# Altium integrated library Weidmueller_OMNIMATE_Signal.IntLib: 2550 symbols (part 1 of 45) (continued)
## 1001720000_Single (continued)
OMNIMATE Signal - series LL; PartNumber: 1001720000; Manufacturer: Weidmueller; Short_text_for_material: LL 5.00/04/90 3.2SN OR BX; Side_termination_characteristic: closed side; Mounting_onto_the_PCB: Solder connection; Pitch_mm: 5 mm; Pitch_inch: 0,197 inch; No_of_poles: 4; Solder_pin_length_mm: 3,2 mm; Contact_material: Cu-Leg; Contact_surface: tinned; Insulating_material: Wemid (PA); UL_94_flammability_rating: V-0; Rated_voltage_for_surge_voltage_class_pollution_degree_II_2: 500 V; Solid_min_H05_07_V_U: 0,5 mm²; Solid_max_H05_07_V_U: 6 mm²; Rated_voltage_use_group_B_UL_1059: 300 V; Rated_current_use_group_B_UL_1059: 20 A; Wire_cross_section_AWG_min_UL_1059: AWG 28; Wire_cross_section_AWG_max_UL_1059: AWG 12; PackageReference: LL_5_00_90_04; Colour: Orange; Packaging: Box; Qty: 100 PCS; Revision: V1; ComponentLink1Description: Manufacturer URL; ComponentLink1URL: http://www.weidmueller.com/; ComponentLink2Description: URL Link1; ComponentLink2URL: http://catalog.weidmueller.com/catalog/Start.do?localeId=en&ObjectID=1001720000
footprint LL_5_00_90_04 (OMNIMATE Signal - Serie LL  LL 5.00/04/90 3.2)
part A pins: A1
part B pins: A2
part C pins: A3
part D pins: A4
1 alternate drawing of the same symbol

## 1001850000
designator E?
OMNIMATE Signal - series LL; PartNumber: 1001850000; Manufacturer: Weidmueller; Short_text_for_material: LL 5.08/04/90 3.2SN OR BX; Side_termination_characteristic: closed side; Mounting_onto_the_PCB: Solder connection; Pitch_mm: 5,08 mm; Pitch_inch: 0,2 inch; No_of_poles: 4; Solder_pin_length_mm: 3,2 mm; Contact_material: Cu-Leg; Contact_surface: tinned; Insulating_material: Wemid (PA); UL_94_flammability_rating: V-0; Rated_voltage_for_surge_voltage_class_pollution_degree_II_2: 500 V; Solid_min_H05_07_V_U: 0,5 mm²; Solid_max_H05_07_V_U: 6 mm²; Rated_voltage_use_group_B_UL_1059: 300 V; Rated_current_use_group_B_UL_1059: 20 A; Wire_cross_section_AWG_min_UL_1059: AWG 28; Wire_cross_section_AWG_max_UL_1059: AWG 12; PackageReference: LL_5_08_90_04; Colour: Orange; Packaging: Box; Qty: 100 PCS; Revision: V1; ComponentLink1Description: Manufacturer URL; ComponentLink1URL: http://www.weidmueller.com/; ComponentLink2Description: URL Link1; ComponentLink2URL: http://catalog.weidmueller.com/catalog/Start.do?localeId=en&ObjectID=1001850000
footprint LL_5_08_90_04 (OMNIMATE Signal - Serie LL  LL 5.08/04/90 3.2)
pins: A1, A2, A3, A4
1 alternate drawing of the same symbol

## 1001850000_Single
designator E?
OMNIMATE Signal - series LL; PartNumber: 1001850000; Manufacturer: Weidmueller; Short_text_for_material: LL 5.08/04/90 3.2SN OR BX; Side_termination_characteristic: closed side; Mounting_onto_the_PCB: Solder connection; Pitch_mm: 5,08 mm; Pitch_inch: 0,2 inch; No_of_poles: 4; Solder_pin_length_mm: 3,2 mm; Contact_material: Cu-Leg; Contact_surface: tinned; Insulating_material: Wemid (PA); UL_94_flammability_rating: V-0; Rated_voltage_for_surge_voltage_class_pollution_degree_II_2: 500 V; Solid_min_H05_07_V_U: 0,5 mm²; Solid_max_H05_07_V_U: 6 mm²; Rated_voltage_use_group_B_UL_1059: 300 V; Rated_current_use_group_B_UL_1059: 20 A; Wire_cross_section_AWG_min_UL_1059: AWG 28; Wire_cross_section_AWG_max_UL_1059: AWG 12; PackageReference: LL_5_08_90_04; Colour: Orange; Packaging: Box; Qty: 100 PCS; Revision: V1; ComponentLink1Description: Manufacturer URL; ComponentLink1URL: http://www.weidmueller.com/; ComponentLink2Description: URL Link1; ComponentLink2URL: http://catalog.weidmueller.com/catalog/Start.do?localeId=en&ObjectID=1001850000
footprint LL_5_08_90_04 (OMNIMATE Signal - Serie LL  LL 5.08/04/90 3.2)
part A pins: A1
part B pins: A2
part C pins: A3
part D pins: A4
1 alternate drawing of the same symbol

## 1028720000
designator J?
OMNIMATE Signal - series BC/SC 3.81; PartNumber: 1028720000; Manufacturer: Weidmueller; Short_text_for_material: BCL-SMT 3.81/02/90LFI 1.5SN BK BX; Side_termination_characteristic: Solder flange inverted; Mounting_onto_the_PCB: Reflow solder connection; Pitch_mm: 3.81 mm; Pitch_inch: 0.15 inch; No_of_poles: 2; Outgoing_elbow: 90°; Solder_pin_length_mm: 1.5 mm; Contact_material: Cu-Leg; Contact_surface: tinned; Insulating_material: LCP GF; UL_94_flammability_rating: V-0; Rated_voltage_for_surge_voltage_class_pollution_degree_II_2: 320 V; Rated_voltage_use_group_B_UL_1059: 300 V; Rated_current_use_group_B_UL_1059: 10 A; PackageReference: BCL_SMT_3_81_90LFI_02; Colour: Black; Packaging: Box; Qty: 50 PCS; Revision: V1; ComponentLink1Description: Manufacturer URL; ComponentLink1URL: http://www.weidmueller.com/; ComponentLink2Description: URL Link1; ComponentLink2URL: http://catalog.weidmueller.com/catalog/Start.do?localeId=en&ObjectID=1028720000
footprint BCL_SMT_3_81_90LFI_02 (OMNIMATE Signal - Serie BC/SC 3.81  BCL-SMT 3.81/02/90LFI 1.5)
pins: A1, A2

## 1028720000_Single
designator J?
OMNIMATE Signal - series BC/SC 3.81; PartNumber: 1028720000; Manufacturer: Weidmueller; Short_text_for_material: BCL-SMT 3.81/02/90LFI 1.5SN BK BX; Side_termination_characteristic: Solder flange inverted; Mounting_onto_the_PCB: Reflow solder connection; Pitch_mm: 3.81 mm; Pitch_inch: 0.15 inch; No_of_poles: 2; Outgoing_elbow: 90°; Solder_pin_length_mm: 1.5 mm; Contact_material: Cu-Leg; Contact_surface: tinned; Insulating_material: LCP GF; UL_94_flammability_rating: V-0; Rated_voltage_for_surge_voltage_class_pollution_degree_II_2: 320 V; Rated_voltage_use_group_B_UL_1059: 300 V; Rated_current_use_group_B_UL_1059: 10 A; PackageReference: BCL_SMT_3_81_90LFI_02; Colour: Black; Packaging: Box; Qty: 50 PCS; Revision: V1; ComponentLink1Description: Manufacturer URL; ComponentLink1URL: http://www.weidmueller.com/; ComponentLink2Description: URL Link1; ComponentLink2URL: http://catalog.weidmueller.com/catalog/Start.do?localeId=en&ObjectID=1028720000
footprint BCL_SMT_3_81_90LFI_02 (OMNIMATE Signal - Serie BC/SC 3.81  BCL-SMT 3.81/02/90LFI 1.5)
part A pins: A1
part B pins: A2

## 1028730000
designator J?
OMNIMATE Signal - series BC/SC 3.81; PartNumber: 1028730000; Manufacturer: Weidmueller; Short_text_for_material: BCL-SMT 3.81/03/90LFI 1.5SN BK BX; Side_termination_characteristic: Solder flange inverted; Mounting_onto_the_PCB: Reflow solder connection; Pitch_mm: 3.81 mm; Pitch_inch: 0.15 inch; No_of_poles: 3; Outgoing_elbow: 90°; Solder_pin_length_mm: 1.5 mm; Contact_material: Cu-Leg; Contact_surface: tinned; Insulating_material: LCP GF; UL_94_flammability_rating: V-0; Rated_voltage_for_surge_voltage_class_pollution_degree_II_2: 320 V; Rated_voltage_use_group_B_UL_1059: 300 V; Rated_current_use_group_B_UL_1059: 10 A; PackageReference: BCL_SMT_3_81_90LFI_03; Colour: Black; Packaging: Box; Qty: 50 PCS; Revision: V1; ComponentLink1Description: Manufacturer URL; ComponentLink1URL: http://www.weidmueller.com/; ComponentLink2Description: URL Link1; ComponentLink2URL: http://catalog.weidmueller.com/catalog/Start.do?localeId=en&ObjectID=1028730000
footprint BCL_SMT_3_81_90LFI_03 (OMNIMATE Signal - Serie BC/SC 3.81  BCL-SMT 3.81/03/90LFI 1.5)
pins: A1, A2, A3

## 1028730000_Single
designator J?
OMNIMATE Signal - series BC/SC 3.81; PartNumber: 1028730000; Manufacturer: Weidmueller; Short_text_for_material: BCL-SMT 3.81/03/90LFI 1.5SN BK BX; Side_termination_characteristic: Solder flange inverted; Mounting_onto_the_PCB: Reflow solder connection; Pitch_mm: 3.81 mm; Pitch_inch: 0.15 inch; No_of_poles: 3; Outgoing_elbow: 90°; Solder_pin_length_mm: 1.5 mm; Contact_material: Cu-Leg; Contact_surface: tinned; Insulating_material: LCP GF; UL_94_flammability_rating: V-0; Rated_voltage_for_surge_voltage_class_pollution_degree_II_2: 320 V; Rated_voltage_use_group_B_UL_1059: 300 V; Rated_current_use_group_B_UL_1059: 10 A; PackageReference: BCL_SMT_3_81_90LFI_03; Colour: Black; Packaging: Box; Qty: 50 PCS; Revision: V1; ComponentLink1Description: Manufacturer URL; ComponentLink1URL: http://www.weidmueller.com/; ComponentLink2Description: URL Link1; ComponentLink2URL: http://catalog.weidmueller.com/catalog/Start.do?localeId=en&ObjectID=1028730000
footprint BCL_SMT_3_81_90LFI_03 (OMNIMATE Signal - Serie BC/SC 3.81  BCL-SMT 3.81/03/90LFI 1.5)
part A pins: A1
part B pins: A2
part C pins: A3

## 1028740000
designator J?
OMNIMATE Signal - series BC/SC 3.81; PartNumber: 1028740000; Manufacturer: Weidmueller; Short_text_for_material: BCL-SMT 3.81/04/90LFI 1.5SN BK BX; Side_termination_characteristic: Solder flange inverted; Mounting_onto_the_PCB: Reflow solder connection; Pitch_mm: 3.81 mm; Pitch_inch: 0.15 inch; No_of_poles: 4; Outgoing_elbow: 90°; Solder_pin_length_mm: 1.5 mm; Contact_material: Cu-Leg; Contact_surface: tinned; Insulating_material: LCP GF; UL_94_flammability_rating: V-0; Rated_voltage_for_surge_voltage_class_pollution_degree_II_2: 320 V; Rated_voltage_use_group_B_UL_1059: 300 V; Rated_current_use_group_B_UL_1059: 10 A; PackageReference: BCL_SMT_3_81_90LFI_04; Colour: Black; Packaging: Box; Qty: 50 PCS; Revision: V1; ComponentLink1Description: Manufacturer URL; ComponentLink1URL: http://www.weidmueller.com/; ComponentLink2Description: URL Link1; ComponentLink2URL: http://catalog.weidmueller.com/catalog/Start.do?localeId=en&ObjectID=1028740000
footprint BCL_SMT_3_81_90LFI_04 (OMNIMATE Signal - Serie BC/SC 3.81  BCL-SMT 3.81/04/90LFI 1.5)
pins: A1, A2, A3, A4

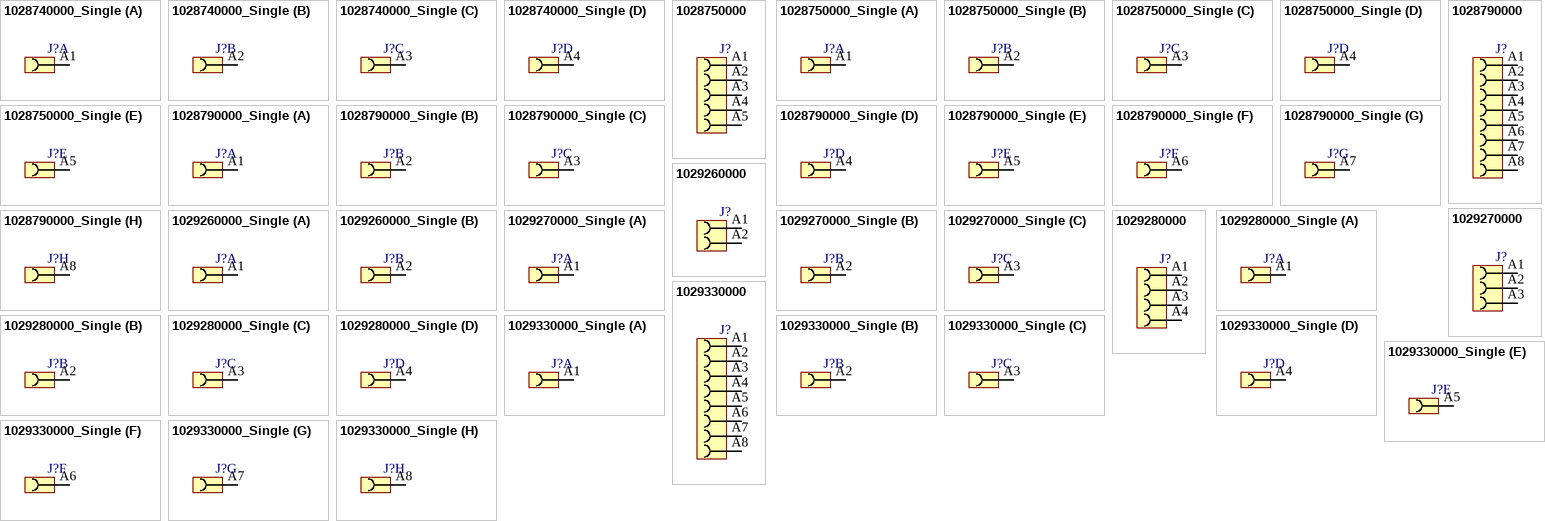
[diagram p2: symbols 1028740000_Single to 1029330000_Single]

## 1028740000_Single
designator J?
OMNIMATE Signal - series BC/SC 3.81; PartNumber: 1028740000; Manufacturer: Weidmueller; Short_text_for_material: BCL-SMT 3.81/04/90LFI 1.5SN BK BX; Side_termination_characteristic: Solder flange inverted; Mounting_onto_the_PCB: Reflow solder connection; Pitch_mm: 3.81 mm; Pitch_inch: 0.15 inch; No_of_poles: 4; Outgoing_elbow: 90°; Solder_pin_length_mm: 1.5 mm; Contact_material: Cu-Leg; Contact_surface: tinned; Insulating_material: LCP GF; UL_94_flammability_rating: V-0; Rated_voltage_for_surge_voltage_class_pollution_degree_II_2: 320 V; Rated_voltage_use_group_B_UL_1059: 300 V; Rated_current_use_group_B_UL_1059: 10 A; PackageReference: BCL_SMT_3_81_90LFI_04; Colour: Black; Packaging: Box; Qty: 50 PCS; Revision: V1; ComponentLink1Description: Manufacturer URL; ComponentLink1URL: http://www.weidmueller.com/; ComponentLink2Description: URL Link1; ComponentLink2URL: http://catalog.weidmueller.com/catalog/Start.do?localeId=en&ObjectID=1028740000
footprint BCL_SMT_3_81_90LFI_04 (OMNIMATE Signal - Serie BC/SC 3.81  BCL-SMT 3.81/04/90LFI 1.5)
part A pins: A1
part B pins: A2
part C pins: A3
part D pins: A4

## 1028750000
designator J?
OMNIMATE Signal - series BC/SC 3.81; PartNumber: 1028750000; Manufacturer: Weidmueller; Short_text_for_material: BCL-SMT 3.81/05/90LFI 1.5SN BK BX; Side_termination_characteristic: Solder flange inverted; Mounting_onto_the_PCB: Reflow solder connection; Pitch_mm: 3.81 mm; Pitch_inch: 0.15 inch; No_of_poles: 5; Outgoing_elbow: 90°; Solder_pin_length_mm: 1.5 mm; Contact_material: Cu-Leg; Contact_surface: tinned; Insulating_material: LCP GF; UL_94_flammability_rating: V-0; Rated_voltage_for_surge_voltage_class_pollution_degree_II_2: 320 V; Rated_voltage_use_group_B_UL_1059: 300 V; Rated_current_use_group_B_UL_1059: 10 A; PackageReference: BCL_SMT_3_81_90LFI_05; Colour: Black; Packaging: Box; Qty: 50 PCS; Revision: V1; ComponentLink1Description: Manufacturer URL; ComponentLink1URL: http://www.weidmueller.com/; ComponentLink2Description: URL Link1; ComponentLink2URL: http://catalog.weidmueller.com/catalog/Start.do?localeId=en&ObjectID=1028750000
footprint BCL_SMT_3_81_90LFI_05 (OMNIMATE Signal - Serie BC/SC 3.81  BCL-SMT 3.81/05/90LFI 1.5)
pins: A1, A2, A3, A4, A5

## 1028750000_Single
designator J?
OMNIMATE Signal - series BC/SC 3.81; PartNumber: 1028750000; Manufacturer: Weidmueller; Short_text_for_material: BCL-SMT 3.81/05/90LFI 1.5SN BK BX; Side_termination_characteristic: Solder flange inverted; Mounting_onto_the_PCB: Reflow solder connection; Pitch_mm: 3.81 mm; Pitch_inch: 0.15 inch; No_of_poles: 5; Outgoing_elbow: 90°; Solder_pin_length_mm: 1.5 mm; Contact_material: Cu-Leg; Contact_surface: tinned; Insulating_material: LCP GF; UL_94_flammability_rating: V-0; Rated_voltage_for_surge_voltage_class_pollution_degree_II_2: 320 V; Rated_voltage_use_group_B_UL_1059: 300 V; Rated_current_use_group_B_UL_1059: 10 A; PackageReference: BCL_SMT_3_81_90LFI_05; Colour: Black; Packaging: Box; Qty: 50 PCS; Revision: V1; ComponentLink1Description: Manufacturer URL; ComponentLink1URL: http://www.weidmueller.com/; ComponentLink2Description: URL Link1; ComponentLink2URL: http://catalog.weidmueller.com/catalog/Start.do?localeId=en&ObjectID=1028750000
footprint BCL_SMT_3_81_90LFI_05 (OMNIMATE Signal - Serie BC/SC 3.81  BCL-SMT 3.81/05/90LFI 1.5)
part A pins: A1
part B pins: A2
part C pins: A3
part D pins: A4
part E pins: A5

## 1028790000
designator J?
OMNIMATE Signal - series BC/SC 3.81; PartNumber: 1028790000; Manufacturer: Weidmueller; Short_text_for_material: BCL-SMT 3.81/08/90LFI 1.5SN BK BX; Side_termination_characteristic: Solder flange inverted; Mounting_onto_the_PCB: Reflow solder connection; Pitch_mm: 3.81 mm; Pitch_inch: 0.15 inch; No_of_poles: 8; Outgoing_elbow: 90°; Solder_pin_length_mm: 1.5 mm; Contact_material: Cu-Leg; Contact_surface: tinned; Insulating_material: LCP GF; UL_94_flammability_rating: V-0; Rated_voltage_for_surge_voltage_class_pollution_degree_II_2: 320 V; Rated_voltage_use_group_B_UL_1059: 300 V; Rated_current_use_group_B_UL_1059: 10 A; PackageReference: BCL_SMT_3_81_90LFI_08; Colour: Black; Packaging: Box; Qty: 50 PCS; Revision: V1; ComponentLink1Description: Manufacturer URL; ComponentLink1URL: http://www.weidmueller.com/; ComponentLink2Description: URL Link1; ComponentLink2URL: http://catalog.weidmueller.com/catalog/Start.do?localeId=en&ObjectID=1028790000
footprint BCL_SMT_3_81_90LFI_08 (OMNIMATE Signal - Serie BC/SC 3.81  BCL-SMT 3.81/08/90LFI 1.5)
pins: A1, A2, A3, A4, A5, A6, A7, A8

## 1028790000_Single
designator J?
OMNIMATE Signal - series BC/SC 3.81; PartNumber: 1028790000; Manufacturer: Weidmueller; Short_text_for_material: BCL-SMT 3.81/08/90LFI 1.5SN BK BX; Side_termination_characteristic: Solder flange inverted; Mounting_onto_the_PCB: Reflow solder connection; Pitch_mm: 3.81 mm; Pitch_inch: 0.15 inch; No_of_poles: 8; Outgoing_elbow: 90°; Solder_pin_length_mm: 1.5 mm; Contact_material: Cu-Leg; Contact_surface: tinned; Insulating_material: LCP GF; UL_94_flammability_rating: V-0; Rated_voltage_for_surge_voltage_class_pollution_degree_II_2: 320 V; Rated_voltage_use_group_B_UL_1059: 300 V; Rated_current_use_group_B_UL_1059: 10 A; PackageReference: BCL_SMT_3_81_90LFI_08; Colour: Black; Packaging: Box; Qty: 50 PCS; Revision: V1; ComponentLink1Description: Manufacturer URL; ComponentLink1URL: http://www.weidmueller.com/; ComponentLink2Description: URL Link1; ComponentLink2URL: http://catalog.weidmueller.com/catalog/Start.do?localeId=en&ObjectID=1028790000
footprint BCL_SMT_3_81_90LFI_08 (OMNIMATE Signal - Serie BC/SC 3.81  BCL-SMT 3.81/08/90LFI 1.5)
part A pins: A1
part B pins: A2
part C pins: A3
part D pins: A4
part E pins: A5
part F pins: A6
part G pins: A7
part H pins: A8

## 1029260000
designator J?
OMNIMATE Signal - series BC/SC 3.81; PartNumber: 1029260000; Manufacturer: Weidmueller; Short_text_for_material: BCL-SMT 3.81/02/180LFI 1.5SN BK BX; Side_termination_characteristic: Solder flange inverted; Mounting_onto_the_PCB: Reflow solder connection; Pitch_mm: 3.81 mm; Pitch_inch: 0.15 inch; No_of_poles: 2; Outgoing_elbow: 180°; Solder_pin_length_mm: 1.5 mm; Contact_material: Cu-Leg; Contact_surface: tinned; Insulating_material: LCP GF; UL_94_flammability_rating: V-0; Rated_voltage_for_surge_voltage_class_pollution_degree_II_2: 320 V; Rated_voltage_use_group_B_UL_1059: 300 V; Rated_current_use_group_B_UL_1059: 10 A; PackageReference: BCL_SMT_3_81_180LFI_02; Colour: Black; Packaging: Box; Qty: 50 PCS; Revision: V1; ComponentLink1Description: Manufacturer URL; ComponentLink1URL: http://www.weidmueller.com/; ComponentLink2Description: URL Link1; ComponentLink2URL: http://catalog.weidmueller.com/catalog/Start.do?localeId=en&ObjectID=1029260000
footprint BCL_SMT_3_81_180LFI_02 (OMNIMATE Signal - Serie BC/SC 3.81  BCL-SMT 3.81/02/180LFI 1.5)
pins: A1, A2

## 1029260000_Single
designator J?
OMNIMATE Signal - series BC/SC 3.81; PartNumber: 1029260000; Manufacturer: Weidmueller; Short_text_for_material: BCL-SMT 3.81/02/180LFI 1.5SN BK BX; Side_termination_characteristic: Solder flange inverted; Mounting_onto_the_PCB: Reflow solder connection; Pitch_mm: 3.81 mm; Pitch_inch: 0.15 inch; No_of_poles: 2; Outgoing_elbow: 180°; Solder_pin_length_mm: 1.5 mm; Contact_material: Cu-Leg; Contact_surface: tinned; Insulating_material: LCP GF; UL_94_flammability_rating: V-0; Rated_voltage_for_surge_voltage_class_pollution_degree_II_2: 320 V; Rated_voltage_use_group_B_UL_1059: 300 V; Rated_current_use_group_B_UL_1059: 10 A; PackageReference: BCL_SMT_3_81_180LFI_02; Colour: Black; Packaging: Box; Qty: 50 PCS; Revision: V1; ComponentLink1Description: Manufacturer URL; ComponentLink1URL: http://www.weidmueller.com/; ComponentLink2Description: URL Link1; ComponentLink2URL: http://catalog.weidmueller.com/catalog/Start.do?localeId=en&ObjectID=1029260000
footprint BCL_SMT_3_81_180LFI_02 (OMNIMATE Signal - Serie BC/SC 3.81  BCL-SMT 3.81/02/180LFI 1.5)
part A pins: A1
part B pins: A2

## 1029270000
designator J?
OMNIMATE Signal - series BC/SC 3.81; PartNumber: 1029270000; Manufacturer: Weidmueller; Short_text_for_material: BCL-SMT 3.81/03/180LFI 1.5SN BK BX; Side_termination_characteristic: Solder flange inverted; Mounting_onto_the_PCB: Reflow solder connection; Pitch_mm: 3.81 mm; Pitch_inch: 0.15 inch; No_of_poles: 3; Outgoing_elbow: 180°; Solder_pin_length_mm: 1.5 mm; Contact_material: Cu-Leg; Contact_surface: tinned; Insulating_material: LCP GF; UL_94_flammability_rating: V-0; Rated_voltage_for_surge_voltage_class_pollution_degree_II_2: 320 V; Rated_voltage_use_group_B_UL_1059: 300 V; Rated_current_use_group_B_UL_1059: 10 A; PackageReference: BCL_SMT_3_81_180LFI_03; Colour: Black; Packaging: Box; Qty: 50 PCS; Revision: V1; ComponentLink1Description: Manufacturer URL; ComponentLink1URL: http://www.weidmueller.com/; ComponentLink2Description: URL Link1; ComponentLink2URL: http://catalog.weidmueller.com/catalog/Start.do?localeId=en&ObjectID=1029270000
footprint BCL_SMT_3_81_180LFI_03 (OMNIMATE Signal - Serie BC/SC 3.81  BCL-SMT 3.81/03/180LFI 1.5)
pins: A1, A2, A3

## 1029270000_Single
designator J?
OMNIMATE Signal - series BC/SC 3.81; PartNumber: 1029270000; Manufacturer: Weidmueller; Short_text_for_material: BCL-SMT 3.81/03/180LFI 1.5SN BK BX; Side_termination_characteristic: Solder flange inverted; Mounting_onto_the_PCB: Reflow solder connection; Pitch_mm: 3.81 mm; Pitch_inch: 0.15 inch; No_of_poles: 3; Outgoing_elbow: 180°; Solder_pin_length_mm: 1.5 mm; Contact_material: Cu-Leg; Contact_surface: tinned; Insulating_material: LCP GF; UL_94_flammability_rating: V-0; Rated_voltage_for_surge_voltage_class_pollution_degree_II_2: 320 V; Rated_voltage_use_group_B_UL_1059: 300 V; Rated_current_use_group_B_UL_1059: 10 A; PackageReference: BCL_SMT_3_81_180LFI_03; Colour: Black; Packaging: Box; Qty: 50 PCS; Revision: V1; ComponentLink1Description: Manufacturer URL; ComponentLink1URL: http://www.weidmueller.com/; ComponentLink2Description: URL Link1; ComponentLink2URL: http://catalog.weidmueller.com/catalog/Start.do?localeId=en&ObjectID=1029270000
footprint BCL_SMT_3_81_180LFI_03 (OMNIMATE Signal - Serie BC/SC 3.81  BCL-SMT 3.81/03/180LFI 1.5)
part A pins: A1
part B pins: A2
part C pins: A3

## 1029280000
designator J?
OMNIMATE Signal - series BC/SC 3.81; PartNumber: 1029280000; Manufacturer: Weidmueller; Short_text_for_material: BCL-SMT 3.81/04/180LFI 1.5SN BK BX; Side_termination_characteristic: Solder flange inverted; Mounting_onto_the_PCB: Reflow solder connection; Pitch_mm: 3.81 mm; Pitch_inch: 0.15 inch; No_of_poles: 4; Outgoing_elbow: 180°; Solder_pin_length_mm: 1.5 mm; Contact_material: Cu-Leg; Contact_surface: tinned; Insulating_material: LCP GF; UL_94_flammability_rating: V-0; Rated_voltage_for_surge_voltage_class_pollution_degree_II_2: 320 V; Rated_voltage_use_group_B_UL_1059: 300 V; Rated_current_use_group_B_UL_1059: 10 A; PackageReference: BCL_SMT_3_81_180LFI_04; Colour: Black; Packaging: Box; Qty: 50 PCS; Revision: V1; ComponentLink1Description: Manufacturer URL; ComponentLink1URL: http://www.weidmueller.com/; ComponentLink2Description: URL Link1; ComponentLink2URL: http://catalog.weidmueller.com/catalog/Start.do?localeId=en&ObjectID=1029280000
footprint BCL_SMT_3_81_180LFI_04 (OMNIMATE Signal - Serie BC/SC 3.81  BCL-SMT 3.81/04/180LFI 1.5)
pins: A1, A2, A3, A4

## 1029280000_Single
designator J?
OMNIMATE Signal - series BC/SC 3.81; PartNumber: 1029280000; Manufacturer: Weidmueller; Short_text_for_material: BCL-SMT 3.81/04/180LFI 1.5SN BK BX; Side_termination_characteristic: Solder flange inverted; Mounting_onto_the_PCB: Reflow solder connection; Pitch_mm: 3.81 mm; Pitch_inch: 0.15 inch; No_of_poles: 4; Outgoing_elbow: 180°; Solder_pin_length_mm: 1.5 mm; Contact_material: Cu-Leg; Contact_surface: tinned; Insulating_material: LCP GF; UL_94_flammability_rating: V-0; Rated_voltage_for_surge_voltage_class_pollution_degree_II_2: 320 V; Rated_voltage_use_group_B_UL_1059: 300 V; Rated_current_use_group_B_UL_1059: 10 A; PackageReference: BCL_SMT_3_81_180LFI_04; Colour: Black; Packaging: Box; Qty: 50 PCS; Revision: V1; ComponentLink1Description: Manufacturer URL; ComponentLink1URL: http://www.weidmueller.com/; ComponentLink2Description: URL Link1; ComponentLink2URL: http://catalog.weidmueller.com/catalog/Start.do?localeId=en&ObjectID=1029280000
footprint BCL_SMT_3_81_180LFI_04 (OMNIMATE Signal - Serie BC/SC 3.81  BCL-SMT 3.81/04/180LFI 1.5)
part A pins: A1
part B pins: A2
part C pins: A3
part D pins: A4

## 1029330000
designator J?
OMNIMATE Signal - series BC/SC 3.81; PartNumber: 1029330000; Manufacturer: Weidmueller; Short_text_for_material: BCL-SMT 3.81/08/180LFI 1.5SN BK BX; Side_termination_characteristic: Solder flange inverted; Mounting_onto_the_PCB: Reflow solder connection; Pitch_mm: 3.81 mm; Pitch_inch: 0.15 inch; No_of_poles: 8; Outgoing_elbow: 180°; Solder_pin_length_mm: 1.5 mm; Contact_material: Cu-Leg; Contact_surface: tinned; Insulating_material: LCP GF; UL_94_flammability_rating: V-0; Rated_voltage_for_surge_voltage_class_pollution_degree_II_2: 320 V; Rated_voltage_use_group_B_UL_1059: 300 V; Rated_current_use_group_B_UL_1059: 10 A; PackageReference: BCL_SMT_3_81_180LFI_08; Colour: Black; Packaging: Box; Qty: 50 PCS; Revision: V1; ComponentLink1Description: Manufacturer URL; ComponentLink1URL: http://www.weidmueller.com/; ComponentLink2Description: URL Link1; ComponentLink2URL: http://catalog.weidmueller.com/catalog/Start.do?localeId=en&ObjectID=1029330000
footprint BCL_SMT_3_81_180LFI_08 (OMNIMATE Signal - Serie BC/SC 3.81  BCL-SMT 3.81/08/180LFI 1.5)
pins: A1, A2, A3, A4, A5, A6, A7, A8

## 1029330000_Single
designator J?
OMNIMATE Signal - series BC/SC 3.81; PartNumber: 1029330000; Manufacturer: Weidmueller; Short_text_for_material: BCL-SMT 3.81/08/180LFI 1.5SN BK BX; Side_termination_characteristic: Solder flange inverted; Mounting_onto_the_PCB: Reflow solder connection; Pitch_mm: 3.81 mm; Pitch_inch: 0.15 inch; No_of_poles: 8; Outgoing_elbow: 180°; Solder_pin_length_mm: 1.5 mm; Contact_material: Cu-Leg; Contact_surface: tinned; Insulating_material: LCP GF; UL_94_flammability_rating: V-0; Rated_voltage_for_surge_voltage_class_pollution_degree_II_2: 320 V; Rated_voltage_use_group_B_UL_1059: 300 V; Rated_current_use_group_B_UL_1059: 10 A; PackageReference: BCL_SMT_3_81_180LFI_08; Colour: Black; Packaging: Box; Qty: 50 PCS; Revision: V1; ComponentLink1Description: Manufacturer URL; ComponentLink1URL: http://www.weidmueller.com/; ComponentLink2Description: URL Link1; ComponentLink2URL: http://catalog.weidmueller.com/catalog/Start.do?localeId=en&ObjectID=1029330000
footprint BCL_SMT_3_81_180LFI_08 (OMNIMATE Signal - Serie BC/SC 3.81  BCL-SMT 3.81/08/180LFI 1.5)
part A pins: A1
part B pins: A2
part C pins: A3
part D pins: A4
part E pins: A5
part F pins: A6
part G pins: A7
part H pins: A8

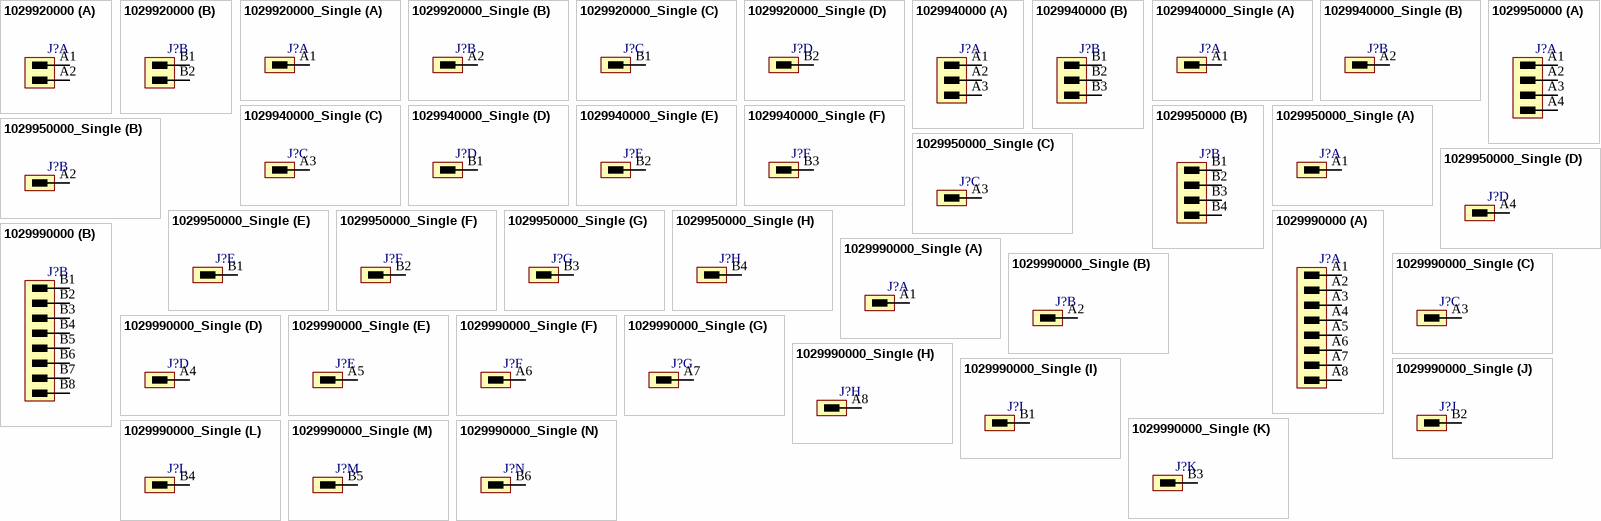
[diagram p3: symbols 1029920000 to 1029990000_Single]

## 1029920000
designator J?
OMNIMATE Signal - series BC/SC 3.81; PartNumber: 1029920000; Manufacturer: Weidmueller; Short_text_for_material: SCD 3.81/04/180G 3.2SN OR BX; Side_termination_characteristic: closed side; Mounting_onto_the_PCB: Solder connection; Pitch_mm: 3.81 mm; Pitch_inch: 0.15 inch; No_of_poles: 4; Outgoing_elbow: 180°; Solder_pin_length_mm: 3.2 mm; Contact_material: Cu-Leg; Contact_surface: tinned; Insulating_material: PA GF; UL_94_flammability_rating: V-0; Rated_voltage_for_surge_voltage_class_pollution_degree_II_2: 320 V; Rated_voltage_use_group_B_UL_1059: 300 V; Rated_current_use_group_B_UL_1059: 10 A; PackageReference: SCD_3_81_180G_04; Colour: Orange; Packaging: Box; Qty: 50 PCS; Revision: V1; ComponentLink1Description: Manufacturer URL; ComponentLink1URL: http://www.weidmueller.com/; ComponentLink2Description: URL Link1; ComponentLink2URL: http://catalog.weidmueller.com/catalog/Start.do?localeId=en&ObjectID=1029920000
footprint SCD_3_81_180G_04 (OMNIMATE Signal - Serie BC/SC 3.81  SCD 3.81/04/180G 3.2)
part A pins: A1, A2
part B pins: B1, B2

## 1029920000_Single
designator J?
OMNIMATE Signal - series BC/SC 3.81; PartNumber: 1029920000; Manufacturer: Weidmueller; Short_text_for_material: SCD 3.81/04/180G 3.2SN OR BX; Side_termination_characteristic: closed side; Mounting_onto_the_PCB: Solder connection; Pitch_mm: 3.81 mm; Pitch_inch: 0.15 inch; No_of_poles: 4; Outgoing_elbow: 180°; Solder_pin_length_mm: 3.2 mm; Contact_material: Cu-Leg; Contact_surface: tinned; Insulating_material: PA GF; UL_94_flammability_rating: V-0; Rated_voltage_for_surge_voltage_class_pollution_degree_II_2: 320 V; Rated_voltage_use_group_B_UL_1059: 300 V; Rated_current_use_group_B_UL_1059: 10 A; PackageReference: SCD_3_81_180G_04; Colour: Orange; Packaging: Box; Qty: 50 PCS; Revision: V1; ComponentLink1Description: Manufacturer URL; ComponentLink1URL: http://www.weidmueller.com/; ComponentLink2Description: URL Link1; ComponentLink2URL: http://catalog.weidmueller.com/catalog/Start.do?localeId=en&ObjectID=1029920000
footprint SCD_3_81_180G_04 (OMNIMATE Signal - Serie BC/SC 3.81  SCD 3.81/04/180G 3.2)
part A pins: A1
part B pins: A2
part C pins: B1
part D pins: B2

## 1029940000
designator J?
OMNIMATE Signal - series BC/SC 3.81; PartNumber: 1029940000; Manufacturer: Weidmueller; Short_text_for_material: SCD 3.81/06/180G 3.2SN OR BX; Side_termination_characteristic: closed side; Mounting_onto_the_PCB: Solder connection; Pitch_mm: 3.81 mm; Pitch_inch: 0.15 inch; No_of_poles: 6; Outgoing_elbow: 180°; Solder_pin_length_mm: 3.2 mm; Contact_material: Cu-Leg; Contact_surface: tinned; Insulating_material: PA GF; UL_94_flammability_rating: V-0; Rated_voltage_for_surge_voltage_class_pollution_degree_II_2: 320 V; Rated_voltage_use_group_B_UL_1059: 300 V; Rated_current_use_group_B_UL_1059: 10 A; PackageReference: SCD_3_81_180G_06; Colour: Orange; Packaging: Box; Qty: 50 PCS; Revision: V1; ComponentLink1Description: Manufacturer URL; ComponentLink1URL: http://www.weidmueller.com/; ComponentLink2Description: URL Link1; ComponentLink2URL: http://catalog.weidmueller.com/catalog/Start.do?localeId=en&ObjectID=1029940000
footprint SCD_3_81_180G_06 (OMNIMATE Signal - Serie BC/SC 3.81  SCD 3.81/06/180G 3.2)
part A pins: A1, A2, A3
part B pins: B1, B2, B3

## 1029940000_Single
designator J?
OMNIMATE Signal - series BC/SC 3.81; PartNumber: 1029940000; Manufacturer: Weidmueller; Short_text_for_material: SCD 3.81/06/180G 3.2SN OR BX; Side_termination_characteristic: closed side; Mounting_onto_the_PCB: Solder connection; Pitch_mm: 3.81 mm; Pitch_inch: 0.15 inch; No_of_poles: 6; Outgoing_elbow: 180°; Solder_pin_length_mm: 3.2 mm; Contact_material: Cu-Leg; Contact_surface: tinned; Insulating_material: PA GF; UL_94_flammability_rating: V-0; Rated_voltage_for_surge_voltage_class_pollution_degree_II_2: 320 V; Rated_voltage_use_group_B_UL_1059: 300 V; Rated_current_use_group_B_UL_1059: 10 A; PackageReference: SCD_3_81_180G_06; Colour: Orange; Packaging: Box; Qty: 50 PCS; Revision: V1; ComponentLink1Description: Manufacturer URL; ComponentLink1URL: http://www.weidmueller.com/; ComponentLink2Description: URL Link1; ComponentLink2URL: http://catalog.weidmueller.com/catalog/Start.do?localeId=en&ObjectID=1029940000
footprint SCD_3_81_180G_06 (OMNIMATE Signal - Serie BC/SC 3.81  SCD 3.81/06/180G 3.2)
part A pins: A1
part B pins: A2
part C pins: A3
part D pins: B1
part E pins: B2
part F pins: B3

## 1029950000
designator J?
OMNIMATE Signal - series BC/SC 3.81; PartNumber: 1029950000; Manufacturer: Weidmueller; Short_text_for_material: SCD 3.81/08/180G 3.2SN OR BX; Side_termination_characteristic: closed side; Mounting_onto_the_PCB: Solder connection; Pitch_mm: 3.81 mm; Pitch_inch: 0.15 inch; No_of_poles: 8; Outgoing_elbow: 180°; Solder_pin_length_mm: 3.2 mm; Contact_material: Cu-Leg; Contact_surface: tinned; Insulating_material: PA GF; UL_94_flammability_rating: V-0; Rated_voltage_for_surge_voltage_class_pollution_degree_II_2: 320 V; Rated_voltage_use_group_B_UL_1059: 300 V; Rated_current_use_group_B_UL_1059: 10 A; PackageReference: SCD_3_81_180G_08; Colour: Orange; Packaging: Box; Qty: 50 PCS; Revision: V1; ComponentLink1Description: Manufacturer URL; ComponentLink1URL: http://www.weidmueller.com/; ComponentLink2Description: URL Link1; ComponentLink2URL: http://catalog.weidmueller.com/catalog/Start.do?localeId=en&ObjectID=1029950000
footprint SCD_3_81_180G_08 (OMNIMATE Signal - Serie BC/SC 3.81  SCD 3.81/08/180G 3.2)
part A pins: A1, A2, A3, A4
part B pins: B1, B2, B3, B4

## 1029950000_Single
designator J?
OMNIMATE Signal - series BC/SC 3.81; PartNumber: 1029950000; Manufacturer: Weidmueller; Short_text_for_material: SCD 3.81/08/180G 3.2SN OR BX; Side_termination_characteristic: closed side; Mounting_onto_the_PCB: Solder connection; Pitch_mm: 3.81 mm; Pitch_inch: 0.15 inch; No_of_poles: 8; Outgoing_elbow: 180°; Solder_pin_length_mm: 3.2 mm; Contact_material: Cu-Leg; Contact_surface: tinned; Insulating_material: PA GF; UL_94_flammability_rating: V-0; Rated_voltage_for_surge_voltage_class_pollution_degree_II_2: 320 V; Rated_voltage_use_group_B_UL_1059: 300 V; Rated_current_use_group_B_UL_1059: 10 A; PackageReference: SCD_3_81_180G_08; Colour: Orange; Packaging: Box; Qty: 50 PCS; Revision: V1; ComponentLink1Description: Manufacturer URL; ComponentLink1URL: http://www.weidmueller.com/; ComponentLink2Description: URL Link1; ComponentLink2URL: http://catalog.weidmueller.com/catalog/Start.do?localeId=en&ObjectID=1029950000
footprint SCD_3_81_180G_08 (OMNIMATE Signal - Serie BC/SC 3.81  SCD 3.81/08/180G 3.2)
part A pins: A1
part B pins: A2
part C pins: A3
part D pins: A4
part E pins: B1
part F pins: B2
part G pins: B3
part H pins: B4

## 1029990000
designator J?
OMNIMATE Signal - series BC/SC 3.81; PartNumber: 1029990000; Manufacturer: Weidmueller; Short_text_for_material: SCD 3.81/16/180G 3.2SN OR BX; Side_termination_characteristic: closed side; Mounting_onto_the_PCB: Solder connection; Pitch_mm: 3.81 mm; Pitch_inch: 0.15 inch; No_of_poles: 16; Outgoing_elbow: 180°; Solder_pin_length_mm: 3.2 mm; Contact_material: Cu-Leg; Contact_surface: tinned; Insulating_material: PA GF; UL_94_flammability_rating: V-0; Rated_voltage_for_surge_voltage_class_pollution_degree_II_2: 320 V; Rated_voltage_use_group_B_UL_1059: 300 V; Rated_current_use_group_B_UL_1059: 10 A; PackageReference: SCD_3_81_180G_16; Colour: Orange; Packaging: Box; Qty: 50 PCS; Revision: V1; ComponentLink1Description: Manufacturer URL; ComponentLink1URL: http://www.weidmueller.com/; ComponentLink2Description: URL Link1; ComponentLink2URL: http://catalog.weidmueller.com/catalog/Start.do?localeId=en&ObjectID=1029990000
footprint SCD_3_81_180G_16 (OMNIMATE Signal - Serie BC/SC 3.81  SCD 3.81/16/180G 3.2)
part A pins: A1, A2, A3, A4, A5, A6, A7, A8
part B pins: B1, B2, B3, B4, B5, B6, B7, B8

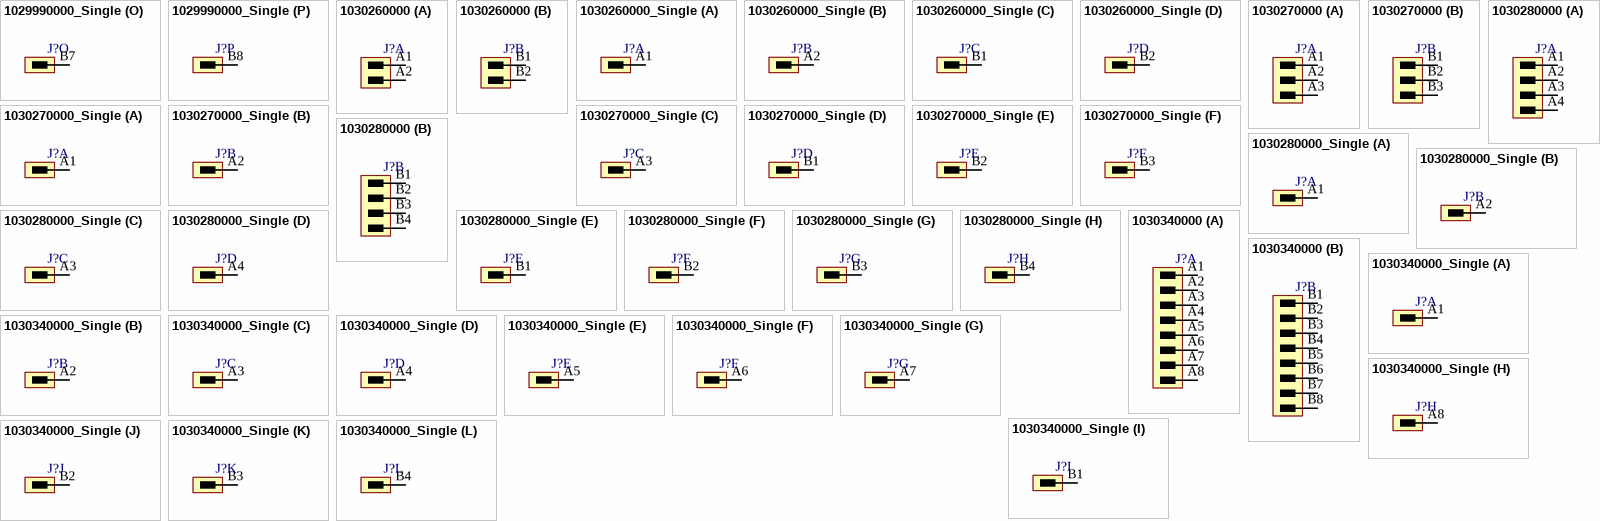
[diagram p4: symbols 1029990000_Single to 1030340000_Single]

## 1029990000_Single
designator J?
OMNIMATE Signal - series BC/SC 3.81; PartNumber: 1029990000; Manufacturer: Weidmueller; Short_text_for_material: SCD 3.81/16/180G 3.2SN OR BX; Side_termination_characteristic: closed side; Mounting_onto_the_PCB: Solder connection; Pitch_mm: 3.81 mm; Pitch_inch: 0.15 inch; No_of_poles: 16; Outgoing_elbow: 180°; Solder_pin_length_mm: 3.2 mm; Contact_material: Cu-Leg; Contact_surface: tinned; Insulating_material: PA GF; UL_94_flammability_rating: V-0; Rated_voltage_for_surge_voltage_class_pollution_degree_II_2: 320 V; Rated_voltage_use_group_B_UL_1059: 300 V; Rated_current_use_group_B_UL_1059: 10 A; PackageReference: SCD_3_81_180G_16; Colour: Orange; Packaging: Box; Qty: 50 PCS; Revision: V1; ComponentLink1Description: Manufacturer URL; ComponentLink1URL: http://www.weidmueller.com/; ComponentLink2Description: URL Link1; ComponentLink2URL: http://catalog.weidmueller.com/catalog/Start.do?localeId=en&ObjectID=1029990000
footprint SCD_3_81_180G_16 (OMNIMATE Signal - Serie BC/SC 3.81  SCD 3.81/16/180G 3.2)
part A pins: A1
part B pins: A2
part C pins: A3
part D pins: A4
part E pins: A5
part F pins: A6
part G pins: A7
part H pins: A8
part I pins: B1
part J pins: B2
part K pins: B3
part L pins: B4
part M pins: B5
part N pins: B6
part O pins: B7
part P pins: B8